# Altium footprint library IC.PcbLib: 386 footprints (part 10 of 30)
Each footprint in its own frame and in the unit in brackets; x right, y up, seen from the top. Pads: shape width x height; smd on the part's side, far side on the other; paste and mask are expansions set on the pad; w line width, h text height; cw(c..) or ccw(c..) is an arc to the next point about the centre after c.
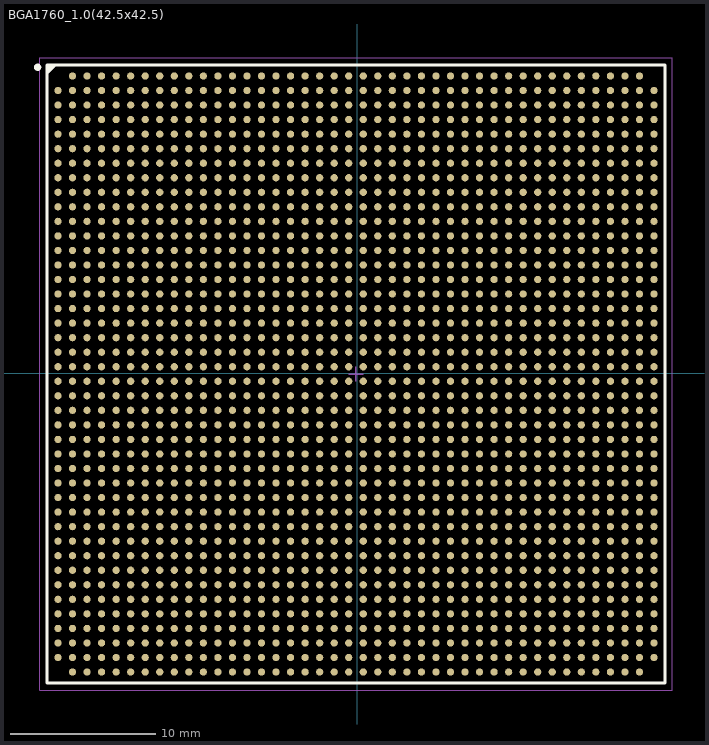
[diagram p9: the footprint, top view; thin cyan lines are the x and y axes]

## BGA1760_1.0(42.5x42.5) [mm]
height 0.65
pads (1760):
  round 0.5 smd: A2(-19.576,20.449) A3(-18.576,20.449) A4(-17.576,20.449) A5(-16.576,20.449) A6(-15.576,20.449) A7(-14.576,20.449) A8(-13.576,20.449) A9(-12.576,20.449) A10(-11.576,20.449) A11(-10.576,20.449) A12(-9.576,20.449) A13(-8.576,20.449) A14(-7.576,20.449) A15(-6.576,20.449) A16(-5.576,20.449) A17(-4.576,20.449) A18(-3.576,20.449) A19(-2.576,20.449) A20(-1.576,20.449) A21(-0.576,20.449) A22(0.424,20.449) A23(1.424,20.449) A24(2.424,20.449) A25(3.424,20.449) A26(4.424,20.449) A27(5.424,20.449) A28(6.424,20.449) A29(7.424,20.449) A30(8.424,20.449) A31(9.424,20.449) A32(10.424,20.449) A33(11.424,20.449) A34(12.424,20.449) A35(13.424,20.449) A36(14.424,20.449) A37(15.424,20.449) A38(16.424,20.449) A39(17.424,20.449) A40(18.424,20.449) A41(19.424,20.449) AA1(-20.576,0.449) AA2(-19.576,0.449) AA3(-18.576,0.449) AA4(-17.576,0.449) AA5(-16.576,0.449) AA6(-15.576,0.449) AA7(-14.576,0.449) AA8(-13.576,0.449) AA9(-12.576,0.449) AA10(-11.576,0.449) AA11(-10.576,0.449) AA12(-9.576,0.449) AA13(-8.576,0.449) AA14(-7.576,0.449) AA15(-6.576,0.449) AA16(-5.576,0.449) AA17(-4.576,0.449) AA18(-3.576,0.449) AA19(-2.576,0.449) AA20(-1.576,0.449) AA21(-0.576,0.449) AA22(0.424,0.449) AA23(1.424,0.449) AA24(2.424,0.449) AA25(3.424,0.449) AA26(4.424,0.449) AA27(5.424,0.449) AA28(6.424,0.449) AA29(7.424,0.449) AA30(8.424,0.449) AA31(9.424,0.449) AA32(10.424,0.449) AA33(11.424,0.449) AA34(12.424,0.449) AA35(13.424,0.449) AA36(14.424,0.449) AA37(15.424,0.449) AA38(16.424,0.449) AA39(17.424,0.449) AA40(18.424,0.449) AA41(19.424,0.449) AA42(20.424,0.449) AB1(-20.576,-0.551) AB2(-19.576,-0.551) AB3(-18.576,-0.551) AB4(-17.576,-0.551) AB5(-16.576,-0.551) AB6(-15.576,-0.551) AB7(-14.576,-0.551) AB8(-13.576,-0.551) AB9(-12.576,-0.551) AB10(-11.576,-0.551) AB11(-10.576,-0.551) AB12(-9.576,-0.551) AB13(-8.576,-0.551) AB14(-7.576,-0.551) AB15(-6.576,-0.551) AB16(-5.576,-0.551) AB17(-4.576,-0.551) AB18(-3.576,-0.551) AB19(-2.576,-0.551) AB20(-1.576,-0.551) AB21(-0.576,-0.551) AB22(0.424,-0.551) AB23(1.424,-0.551) AB24(2.424,-0.551) AB25(3.424,-0.551) AB26(4.424,-0.551) AB27(5.424,-0.551) AB28(6.424,-0.551) AB29(7.424,-0.551) AB30(8.424,-0.551) AB31(9.424,-0.551) AB32(10.424,-0.551) AB33(11.424,-0.551) AB34(12.424,-0.551) AB35(13.424,-0.551) AB36(14.424,-0.551) AB37(15.424,-0.551) AB38(16.424,-0.551) AB39(17.424,-0.551) AB40(18.424,-0.551) AB41(19.424,-0.551) AB42(20.424,-0.551) AC1(-20.576,-1.551) AC2(-19.576,-1.551) AC3(-18.576,-1.551) AC4(-17.576,-1.551) AC5(-16.576,-1.551) AC6(-15.576,-1.551) AC7(-14.576,-1.551) AC8(-13.576,-1.551) AC9(-12.576,-1.551) AC10(-11.576,-1.551) AC11(-10.576,-1.551) AC12(-9.576,-1.551) AC13(-8.576,-1.551) AC14(-7.576,-1.551) AC15(-6.576,-1.551) AC16(-5.576,-1.551) AC17(-4.576,-1.551) AC18(-3.576,-1.551) AC19(-2.576,-1.551) AC20(-1.576,-1.551) AC21(-0.576,-1.551) AC22(0.424,-1.551) AC23(1.424,-1.551) AC24(2.424,-1.551) AC25(3.424,-1.551) AC26(4.424,-1.551) AC27(5.424,-1.551) AC28(6.424,-1.551) AC29(7.424,-1.551) AC30(8.424,-1.551) AC31(9.424,-1.551) AC32(10.424,-1.551) AC33(11.424,-1.551) AC34(12.424,-1.551) AC35(13.424,-1.551) AC36(14.424,-1.551) AC37(15.424,-1.551) AC38(16.424,-1.551) AC39(17.424,-1.551) AC40(18.424,-1.551) AC41(19.424,-1.551) AC42(20.424,-1.551) AD1(-20.576,-2.551) AD2(-19.576,-2.551) AD3(-18.576,-2.551) AD4(-17.576,-2.551) AD5(-16.576,-2.551) AD6(-15.576,-2.551) AD7(-14.576,-2.551) AD8(-13.576,-2.551) AD9(-12.576,-2.551) AD10(-11.576,-2.551) AD11(-10.576,-2.551) AD12(-9.576,-2.551) AD13(-8.576,-2.551) AD14(-7.576,-2.551) AD15(-6.576,-2.551) AD16(-5.576,-2.551) AD17(-4.576,-2.551) AD18(-3.576,-2.551) AD19(-2.576,-2.551) AD20(-1.576,-2.551) AD21(-0.576,-2.551) AD22(0.424,-2.551) AD23(1.424,-2.551) AD24(2.424,-2.551) AD25(3.424,-2.551) AD26(4.424,-2.551) AD27(5.424,-2.551) AD28(6.424,-2.551) AD29(7.424,-2.551) AD30(8.424,-2.551) AD31(9.424,-2.551) AD32(10.424,-2.551) AD33(11.424,-2.551) AD34(12.424,-2.551) AD35(13.424,-2.551) AD36(14.424,-2.551) AD37(15.424,-2.551) AD38(16.424,-2.551) AD39(17.424,-2.551) AD40(18.424,-2.551) AD41(19.424,-2.551) AD42(20.424,-2.551) AE1(-20.576,-3.551) AE2(-19.576,-3.551) AE3(-18.576,-3.551) AE4(-17.576,-3.551) AE5(-16.576,-3.551) AE6(-15.576,-3.551) AE7(-14.576,-3.551) AE8(-13.576,-3.551) AE9(-12.576,-3.551) AE10(-11.576,-3.551) AE11(-10.576,-3.551) AE12(-9.576,-3.551) AE13(-8.576,-3.551) AE14(-7.576,-3.551) AE15(-6.576,-3.551) AE16(-5.576,-3.551) AE17(-4.576,-3.551) AE18(-3.576,-3.551) AE19(-2.576,-3.551) AE20(-1.576,-3.551) AE21(-0.576,-3.551) AE22(0.424,-3.551) AE23(1.424,-3.551) AE24(2.424,-3.551) AE25(3.424,-3.551) AE26(4.424,-3.551) AE27(5.424,-3.551) AE28(6.424,-3.551) AE29(7.424,-3.551) AE30(8.424,-3.551) AE31(9.424,-3.551) AE32(10.424,-3.551) AE33(11.424,-3.551) AE34(12.424,-3.551) AE35(13.424,-3.551) AE36(14.424,-3.551) AE37(15.424,-3.551) AE38(16.424,-3.551) AE39(17.424,-3.551) AE40(18.424,-3.551) AE41(19.424,-3.551) AE42(20.424,-3.551) AF1(-20.576,-4.551) AF2(-19.576,-4.551) AF3(-18.576,-4.551) AF4(-17.576,-4.551) AF5(-16.576,-4.551) AF6(-15.576,-4.551) AF7(-14.576,-4.551) AF8(-13.576,-4.551) AF9(-12.576,-4.551) AF10(-11.576,-4.551) AF11(-10.576,-4.551) AF12(-9.576,-4.551) AF13(-8.576,-4.551) AF14(-7.576,-4.551) AF15(-6.576,-4.551) AF16(-5.576,-4.551) AF17(-4.576,-4.551) AF18(-3.576,-4.551) AF19(-2.576,-4.551) AF20(-1.576,-4.551) AF21(-0.576,-4.551) AF22(0.424,-4.551) AF23(1.424,-4.551) AF24(2.424,-4.551) AF25(3.424,-4.551) AF26(4.424,-4.551) AF27(5.424,-4.551) AF28(6.424,-4.551) AF29(7.424,-4.551) AF30(8.424,-4.551) AF31(9.424,-4.551) AF32(10.424,-4.551) AF33(11.424,-4.551) AF34(12.424,-4.551) AF35(13.424,-4.551) AF36(14.424,-4.551) AF37(15.424,-4.551) AF38(16.424,-4.551) AF39(17.424,-4.551) AF40(18.424,-4.551) AF41(19.424,-4.551) AF42(20.424,-4.551) AG1(-20.576,-5.551) AG2(-19.576,-5.551) AG3(-18.576,-5.551) AG4(-17.576,-5.551) AG5(-16.576,-5.551) AG6(-15.576,-5.551) AG7(-14.576,-5.551) AG8(-13.576,-5.551) AG9(-12.576,-5.551) AG10(-11.576,-5.551) AG11(-10.576,-5.551) AG12(-9.576,-5.551) AG13(-8.576,-5.551) AG14(-7.576,-5.551) AG15(-6.576,-5.551) AG16(-5.576,-5.551) AG17(-4.576,-5.551) AG18(-3.576,-5.551) AG19(-2.576,-5.551) AG20(-1.576,-5.551) AG21(-0.576,-5.551) AG22(0.424,-5.551) AG23(1.424,-5.551) AG24(2.424,-5.551) AG25(3.424,-5.551) AG26(4.424,-5.551) AG27(5.424,-5.551) AG28(6.424,-5.551) AG29(7.424,-5.551) AG30(8.424,-5.551) AG31(9.424,-5.551) AG32(10.424,-5.551) AG33(11.424,-5.551) AG34(12.424,-5.551) AG35(13.424,-5.551) AG36(14.424,-5.551) AG37(15.424,-5.551) AG38(16.424,-5.551) AG39(17.424,-5.551) AG40(18.424,-5.551) AG41(19.424,-5.551) AG42(20.424,-5.551) AH1(-20.576,-6.551) AH2(-19.576,-6.551) AH3(-18.576,-6.551) AH4(-17.576,-6.551) AH5(-16.576,-6.551) AH6(-15.576,-6.551) AH7(-14.576,-6.551) AH8(-13.576,-6.551) AH9(-12.576,-6.551) AH10(-11.576,-6.551) AH11(-10.576,-6.551) AH12(-9.576,-6.551) AH13(-8.576,-6.551) AH14(-7.576,-6.551) AH15(-6.576,-6.551) AH16(-5.576,-6.551) AH17(-4.576,-6.551) AH18(-3.576,-6.551) AH19(-2.576,-6.551) AH20(-1.576,-6.551) AH21(-0.576,-6.551) AH22(0.424,-6.551) AH23(1.424,-6.551) AH24(2.424,-6.551) AH25(3.424,-6.551) AH26(4.424,-6.551) AH27(5.424,-6.551) AH28(6.424,-6.551) AH29(7.424,-6.551) AH30(8.424,-6.551) AH31(9.424,-6.551) AH32(10.424,-6.551) AH33(11.424,-6.551) AH34(12.424,-6.551) AH35(13.424,-6.551) AH36(14.424,-6.551) AH37(15.424,-6.551) AH38(16.424,-6.551) AH39(17.424,-6.551) AH40(18.424,-6.551) AH41(19.424,-6.551) AH42(20.424,-6.551) AJ1(-20.576,-7.551) AJ2(-19.576,-7.551) AJ3(-18.576,-7.551) AJ4(-17.576,-7.551) AJ5(-16.576,-7.551) AJ6(-15.576,-7.551) AJ7(-14.576,-7.551) AJ8(-13.576,-7.551) AJ9(-12.576,-7.551) AJ10(-11.576,-7.551) AJ11(-10.576,-7.551) AJ12(-9.576,-7.551) AJ13(-8.576,-7.551) AJ14(-7.576,-7.551) AJ15(-6.576,-7.551) AJ16(-5.576,-7.551) AJ17(-4.576,-7.551) AJ18(-3.576,-7.551) AJ19(-2.576,-7.551) AJ20(-1.576,-7.551) AJ21(-0.576,-7.551) AJ22(0.424,-7.551) AJ23(1.424,-7.551) AJ24(2.424,-7.551) AJ25(3.424,-7.551) AJ26(4.424,-7.551) AJ27(5.424,-7.551) AJ28(6.424,-7.551) AJ29(7.424,-7.551) AJ30(8.424,-7.551) AJ31(9.424,-7.551) AJ32(10.424,-7.551) AJ33(11.424,-7.551) AJ34(12.424,-7.551) AJ35(13.424,-7.551) AJ36(14.424,-7.551) AJ37(15.424,-7.551) AJ38(16.424,-7.551) AJ39(17.424,-7.551) AJ40(18.424,-7.551) AJ41(19.424,-7.551) AJ42(20.424,-7.551) AK1(-20.576,-8.551) AK2(-19.576,-8.551) AK3(-18.576,-8.551) AK4(-17.576,-8.551) AK5(-16.576,-8.551) AK6(-15.576,-8.551) AK7(-14.576,-8.551) AK8(-13.576,-8.551) AK9(-12.576,-8.551) AK10(-11.576,-8.551) AK11(-10.576,-8.551) AK12(-9.576,-8.551) AK13(-8.576,-8.551) AK14(-7.576,-8.551) AK15(-6.576,-8.551) AK16(-5.576,-8.551) AK17(-4.576,-8.551) AK18(-3.576,-8.551) AK19(-2.576,-8.551) AK20(-1.576,-8.551) AK21(-0.576,-8.551) AK22(0.424,-8.551) AK23(1.424,-8.551) AK24(2.424,-8.551) AK25(3.424,-8.551) AK26(4.424,-8.551) AK27(5.424,-8.551) AK28(6.424,-8.551) AK29(7.424,-8.551) AK30(8.424,-8.551) AK31(9.424,-8.551) AK32(10.424,-8.551) AK33(11.424,-8.551) AK34(12.424,-8.551) AK35(13.424,-8.551) AK36(14.424,-8.551) AK37(15.424,-8.551) AK38(16.424,-8.551) AK39(17.424,-8.551) AK40(18.424,-8.551) AK41(19.424,-8.551) AK42(20.424,-8.551) AL1(-20.576,-9.551) AL2(-19.576,-9.551) AL3(-18.576,-9.551) AL4(-17.576,-9.551) AL5(-16.576,-9.551) AL6(-15.576,-9.551) AL7(-14.576,-9.551) AL8(-13.576,-9.551) AL9(-12.576,-9.551) AL10(-11.576,-9.551) AL11(-10.576,-9.551) AL12(-9.576,-9.551) AL13(-8.576,-9.551) AL14(-7.576,-9.551) AL15(-6.576,-9.551) AL16(-5.576,-9.551) AL17(-4.576,-9.551) AL18(-3.576,-9.551) AL19(-2.576,-9.551) AL20(-1.576,-9.551) AL21(-0.576,-9.551) AL22(0.424,-9.551) AL23(1.424,-9.551) AL24(2.424,-9.551) AL25(3.424,-9.551) AL26(4.424,-9.551) AL27(5.424,-9.551) AL28(6.424,-9.551) AL29(7.424,-9.551) AL30(8.424,-9.551) AL31(9.424,-9.551) AL32(10.424,-9.551) AL33(11.424,-9.551) AL34(12.424,-9.551) AL35(13.424,-9.551) AL36(14.424,-9.551) AL37(15.424,-9.551) AL38(16.424,-9.551) AL39(17.424,-9.551) AL40(18.424,-9.551) AL41(19.424,-9.551) AL42(20.424,-9.551) AM1(-20.576,-10.551) AM2(-19.576,-10.551) AM3(-18.576,-10.551) AM4(-17.576,-10.551) AM5(-16.576,-10.551) AM6(-15.576,-10.551) AM7(-14.576,-10.551) AM8(-13.576,-10.551) AM9(-12.576,-10.551) AM10(-11.576,-10.551) AM11(-10.576,-10.551) AM12(-9.576,-10.551) AM13(-8.576,-10.551) AM14(-7.576,-10.551) AM15(-6.576,-10.551) AM16(-5.576,-10.551) AM17(-4.576,-10.551) AM18(-3.576,-10.551) AM19(-2.576,-10.551) AM20(-1.576,-10.551) AM21(-0.576,-10.551) AM22(0.424,-10.551) AM23(1.424,-10.551) AM24(2.424,-10.551) AM25(3.424,-10.551) AM26(4.424,-10.551) AM27(5.424,-10.551) AM28(6.424,-10.551) AM29(7.424,-10.551) AM30(8.424,-10.551) AM31(9.424,-10.551) AM32(10.424,-10.551) AM33(11.424,-10.551) AM34(12.424,-10.551) AM35(13.424,-10.551) AM36(14.424,-10.551) AM37(15.424,-10.551) AM38(16.424,-10.551) AM39(17.424,-10.551) AM40(18.424,-10.551) AM41(19.424,-10.551) AM42(20.424,-10.551) AN1(-20.576,-11.551) AN2(-19.576,-11.551) AN3(-18.576,-11.551) AN4(-17.576,-11.551) AN5(-16.576,-11.551) AN6(-15.576,-11.551) AN7(-14.576,-11.551) AN8(-13.576,-11.551) AN9(-12.576,-11.551) AN10(-11.576,-11.551) AN11(-10.576,-11.551) AN12(-9.576,-11.551) AN13(-8.576,-11.551) AN14(-7.576,-11.551) AN15(-6.576,-11.551) AN16(-5.576,-11.551) AN17(-4.576,-11.551) AN18(-3.576,-11.551) AN19(-2.576,-11.551) AN20(-1.576,-11.551) AN21(-0.576,-11.551) AN22(0.424,-11.551) AN23(1.424,-11.551) AN24(2.424,-11.551) AN25(3.424,-11.551) AN26(4.424,-11.551) AN27(5.424,-11.551) AN28(6.424,-11.551) AN29(7.424,-11.551) AN30(8.424,-11.551) AN31(9.424,-11.551) AN32(10.424,-11.551) AN33(11.424,-11.551) AN34(12.424,-11.551) AN35(13.424,-11.551) AN36(14.424,-11.551) AN37(15.424,-11.551) AN38(16.424,-11.551) AN39(17.424,-11.551) AN40(18.424,-11.551) AN41(19.424,-11.551) AN42(20.424,-11.551) AP1(-20.576,-12.551) AP2(-19.576,-12.551) AP3(-18.576,-12.551) AP4(-17.576,-12.551) AP5(-16.576,-12.551) AP6(-15.576,-12.551) AP7(-14.576,-12.551) AP8(-13.576,-12.551) AP9(-12.576,-12.551) AP10(-11.576,-12.551) AP11(-10.576,-12.551) AP12(-9.576,-12.551) AP13(-8.576,-12.551) AP14(-7.576,-12.551) AP15(-6.576,-12.551) AP16(-5.576,-12.551) AP17(-4.576,-12.551) AP18(-3.576,-12.551) AP19(-2.576,-12.551) AP20(-1.576,-12.551) AP21(-0.576,-12.551) AP22(0.424,-12.551) AP23(1.424,-12.551) AP24(2.424,-12.551) AP25(3.424,-12.551) AP26(4.424,-12.551) AP27(5.424,-12.551) AP28(6.424,-12.551) AP29(7.424,-12.551) AP30(8.424,-12.551) AP31(9.424,-12.551) AP32(10.424,-12.551) AP33(11.424,-12.551) AP34(12.424,-12.551) AP35(13.424,-12.551) AP36(14.424,-12.551) AP37(15.424,-12.551) AP38(16.424,-12.551) AP39(17.424,-12.551) AP40(18.424,-12.551) AP41(19.424,-12.551) AP42(20.424,-12.551) AR1(-20.576,-13.551) AR2(-19.576,-13.551) AR3(-18.576,-13.551) AR4(-17.576,-13.551) AR5(-16.576,-13.551) AR6(-15.576,-13.551) AR7(-14.576,-13.551) AR8(-13.576,-13.551) AR9(-12.576,-13.551) AR10(-11.576,-13.551) AR11(-10.576,-13.551) AR12(-9.576,-13.551) AR13(-8.576,-13.551) AR14(-7.576,-13.551) AR15(-6.576,-13.551) AR16(-5.576,-13.551) AR17(-4.576,-13.551) AR18(-3.576,-13.551) AR19(-2.576,-13.551) AR20(-1.576,-13.551) AR21(-0.576,-13.551) AR22(0.424,-13.551) AR23(1.424,-13.551) AR24(2.424,-13.551) AR25(3.424,-13.551) AR26(4.424,-13.551) AR27(5.424,-13.551) AR28(6.424,-13.551) AR29(7.424,-13.551) AR30(8.424,-13.551) AR31(9.424,-13.551) AR32(10.424,-13.551) AR33(11.424,-13.551) AR34(12.424,-13.551) AR35(13.424,-13.551) AR36(14.424,-13.551) AR37(15.424,-13.551) AR38(16.424,-13.551) AR39(17.424,-13.551) AR40(18.424,-13.551) AR41(19.424,-13.551) AR42(20.424,-13.551) AT1(-20.576,-14.551) AT2(-19.576,-14.551) AT3(-18.576,-14.551) AT4(-17.576,-14.551) AT5(-16.576,-14.551) AT6(-15.576,-14.551) AT7(-14.576,-14.551) AT8(-13.576,-14.551) AT9(-12.576,-14.551) AT10(-11.576,-14.551) AT11(-10.576,-14.551) AT12(-9.576,-14.551) AT13(-8.576,-14.551) AT14(-7.576,-14.551) AT15(-6.576,-14.551) AT16(-5.576,-14.551) AT17(-4.576,-14.551) AT18(-3.576,-14.551) AT19(-2.576,-14.551) AT20(-1.576,-14.551) AT21(-0.576,-14.551) AT22(0.424,-14.551) AT23(1.424,-14.551) AT24(2.424,-14.551) AT25(3.424,-14.551) AT26(4.424,-14.551) AT27(5.424,-14.551) AT28(6.424,-14.551) AT29(7.424,-14.551) AT30(8.424,-14.551) AT31(9.424,-14.551) AT32(10.424,-14.551) AT33(11.424,-14.551) AT34(12.424,-14.551) AT35(13.424,-14.551) AT36(14.424,-14.551) AT37(15.424,-14.551) AT38(16.424,-14.551) AT39(17.424,-14.551) AT40(18.424,-14.551) AT41(19.424,-14.551) AT42(20.424,-14.551) AU1(-20.576,-15.551) AU2(-19.576,-15.551) AU3(-18.576,-15.551) AU4(-17.576,-15.551) AU5(-16.576,-15.551) AU6(-15.576,-15.551) AU7(-14.576,-15.551) AU8(-13.576,-15.551) AU9(-12.576,-15.551) AU10(-11.576,-15.551) AU11(-10.576,-15.551) AU12(-9.576,-15.551) AU13(-8.576,-15.551) AU14(-7.576,-15.551) AU15(-6.576,-15.551) AU16(-5.576,-15.551) AU17(-4.576,-15.551) AU18(-3.576,-15.551) AU19(-2.576,-15.551) AU20(-1.576,-15.551) AU21(-0.576,-15.551) AU22(0.424,-15.551) AU23(1.424,-15.551) AU24(2.424,-15.551) AU25(3.424,-15.551) AU26(4.424,-15.551) AU27(5.424,-15.551) AU28(6.424,-15.551) AU29(7.424,-15.551) AU30(8.424,-15.551) AU31(9.424,-15.551) AU32(10.424,-15.551) AU33(11.424,-15.551) AU34(12.424,-15.551) AU35(13.424,-15.551) AU36(14.424,-15.551) AU37(15.424,-15.551) AU38(16.424,-15.551) AU39(17.424,-15.551) AU40(18.424,-15.551) AU41(19.424,-15.551) AU42(20.424,-15.551) AV1(-20.576,-16.551) AV2(-19.576,-16.551) AV3(-18.576,-16.551) AV4(-17.576,-16.551) AV5(-16.576,-16.551) AV6(-15.576,-16.551) AV7(-14.576,-16.551) AV8(-13.576,-16.551) AV9(-12.576,-16.551) AV10(-11.576,-16.551) AV11(-10.576,-16.551) AV12(-9.576,-16.551) AV13(-8.576,-16.551) AV14(-7.576,-16.551) AV15(-6.576,-16.551) AV16(-5.576,-16.551) AV17(-4.576,-16.551) AV18(-3.576,-16.551) AV19(-2.576,-16.551) AV20(-1.576,-16.551) AV21(-0.576,-16.551) AV22(0.424,-16.551) AV23(1.424,-16.551) AV24(2.424,-16.551) AV25(3.424,-16.551) AV26(4.424,-16.551) AV27(5.424,-16.551) AV28(6.424,-16.551) AV29(7.424,-16.551) AV30(8.424,-16.551) AV31(9.424,-16.551) AV32(10.424,-16.551) AV33(11.424,-16.551) AV34(12.424,-16.551) AV35(13.424,-16.551) AV36(14.424,-16.551) AV37(15.424,-16.551) AV38(16.424,-16.551) AV39(17.424,-16.551) AV40(18.424,-16.551) AV41(19.424,-16.551) AV42(20.424,-16.551) AW1(-20.576,-17.551) AW2(-19.576,-17.551) AW3(-18.576,-17.551) AW4(-17.576,-17.551) AW5(-16.576,-17.551) AW6(-15.576,-17.551) AW7(-14.576,-17.551) AW8(-13.576,-17.551) AW9(-12.576,-17.551) AW10(-11.576,-17.551) AW11(-10.576,-17.551) AW12(-9.576,-17.551) AW13(-8.576,-17.551) AW14(-7.576,-17.551) AW15(-6.576,-17.551) AW16(-5.576,-17.551) AW17(-4.576,-17.551) AW18(-3.576,-17.551) AW19(-2.576,-17.551) AW20(-1.576,-17.551) AW21(-0.576,-17.551) AW22(0.424,-17.551) AW23(1.424,-17.551) AW24(2.424,-17.551) AW25(3.424,-17.551) AW26(4.424,-17.551) AW27(5.424,-17.551) AW28(6.424,-17.551) AW29(7.424,-17.551) AW30(8.424,-17.551) AW31(9.424,-17.551) AW32(10.424,-17.551) AW33(11.424,-17.551) AW34(12.424,-17.551) AW35(13.424,-17.551) AW36(14.424,-17.551) AW37(15.424,-17.551) AW38(16.424,-17.551) AW39(17.424,-17.551) AW40(18.424,-17.551) AW41(19.424,-17.551) AW42(20.424,-17.551) AY1(-20.576,-18.551) AY2(-19.576,-18.551) AY3(-18.576,-18.551) AY4(-17.576,-18.551) AY5(-16.576,-18.551) AY6(-15.576,-18.551) AY7(-14.576,-18.551) AY8(-13.576,-18.551) AY9(-12.576,-18.551) AY10(-11.576,-18.551) AY11(-10.576,-18.551) AY12(-9.576,-18.551) AY13(-8.576,-18.551) AY14(-7.576,-18.551) AY15(-6.576,-18.551) AY16(-5.576,-18.551) AY17(-4.576,-18.551) AY18(-3.576,-18.551) AY19(-2.576,-18.551) AY20(-1.576,-18.551) AY21(-0.576,-18.551) AY22(0.424,-18.551) AY23(1.424,-18.551) AY24(2.424,-18.551) AY25(3.424,-18.551) AY26(4.424,-18.551) AY27(5.424,-18.551) AY28(6.424,-18.551) AY29(7.424,-18.551) AY30(8.424,-18.551) AY31(9.424,-18.551) AY32(10.424,-18.551) AY33(11.424,-18.551) AY34(12.424,-18.551) AY35(13.424,-18.551) AY36(14.424,-18.551) AY37(15.424,-18.551) AY38(16.424,-18.551) AY39(17.424,-18.551) AY40(18.424,-18.551) AY41(19.424,-18.551) AY42(20.424,-18.551) B1(-20.576,19.449) B2(-19.576,19.449) B3(-18.576,19.449) B4(-17.576,19.449) B5(-16.576,19.449) B6(-15.576,19.449) B7(-14.576,19.449) B8(-13.576,19.449) B9(-12.576,19.449) B10(-11.576,19.449) B11(-10.576,19.449) B12(-9.576,19.449) B13(-8.576,19.449) B14(-7.576,19.449) B15(-6.576,19.449) B16(-5.576,19.449) B17(-4.576,19.449) B18(-3.576,19.449) B19(-2.576,19.449) B20(-1.576,19.449) B21(-0.576,19.449) B22(0.424,19.449) B23(1.424,19.449) B24(2.424,19.449) B25(3.424,19.449) B26(4.424,19.449) B27(5.424,19.449) B28(6.424,19.449) B29(7.424,19.449) B30(8.424,19.449) B31(9.424,19.449) B32(10.424,19.449) B33(11.424,19.449) B34(12.424,19.449) B35(13.424,19.449) B36(14.424,19.449) B37(15.424,19.449) B38(16.424,19.449) B39(17.424,19.449) B40(18.424,19.449) B41(19.424,19.449) B42(20.424,19.449) BA1(-20.576,-19.551) BA2(-19.576,-19.551) BA3(-18.576,-19.551) BA4(-17.576,-19.551) BA5(-16.576,-19.551) BA6(-15.576,-19.551) BA7(-14.576,-19.551) BA8(-13.576,-19.551) BA9(-12.576,-19.551) BA10(-11.576,-19.551) BA11(-10.576,-19.551) BA12(-9.576,-19.551) BA13(-8.576,-19.551) BA14(-7.576,-19.551) BA15(-6.576,-19.551) BA16(-5.576,-19.551) BA17(-4.576,-19.551) BA18(-3.576,-19.551) BA19(-2.576,-19.551) BA20(-1.576,-19.551) BA21(-0.576,-19.551) BA22(0.424,-19.551) BA23(1.424,-19.551) BA24(2.424,-19.551) BA25(3.424,-19.551) BA26(4.424,-19.551) BA27(5.424,-19.551) BA28(6.424,-19.551) BA29(7.424,-19.551) BA30(8.424,-19.551) BA31(9.424,-19.551) BA32(10.424,-19.551) BA33(11.424,-19.551) BA34(12.424,-19.551) BA35(13.424,-19.551) BA36(14.424,-19.551) BA37(15.424,-19.551) BA38(16.424,-19.551) BA39(17.424,-19.551) BA40(18.424,-19.551) BA41(19.424,-19.551) BA42(20.424,-19.551) BB2(-19.576,-20.551) BB3(-18.576,-20.551) BB4(-17.576,-20.551) BB5(-16.576,-20.551) BB6(-15.576,-20.551) BB7(-14.576,-20.551) BB8(-13.576,-20.551) BB9(-12.576,-20.551) BB10(-11.576,-20.551) BB11(-10.576,-20.551) BB12(-9.576,-20.551) BB13(-8.576,-20.551) BB14(-7.576,-20.551) BB15(-6.576,-20.551) BB16(-5.576,-20.551) BB17(-4.576,-20.551) BB18(-3.576,-20.551) BB19(-2.576,-20.551) BB20(-1.576,-20.551) BB21(-0.576,-20.551) BB22(0.424,-20.551) BB23(1.424,-20.551) BB24(2.424,-20.551) BB25(3.424,-20.551) BB26(4.424,-20.551) BB27(5.424,-20.551) BB28(6.424,-20.551) BB29(7.424,-20.551) BB30(8.424,-20.551) BB31(9.424,-20.551) BB32(10.424,-20.551) BB33(11.424,-20.551) BB34(12.424,-20.551) BB35(13.424,-20.551) BB36(14.424,-20.551) BB37(15.424,-20.551) BB38(16.424,-20.551) BB39(17.424,-20.551) BB40(18.424,-20.551) BB41(19.424,-20.551) C1(-20.576,18.449) C2(-19.576,18.449) C3(-18.576,18.449) C4(-17.576,18.449) C5(-16.576,18.449) C6(-15.576,18.449) C7(-14.576,18.449) C8(-13.576,18.449) C9(-12.576,18.449) C10(-11.576,18.449) C11(-10.576,18.449) C12(-9.576,18.449) C13(-8.576,18.449) C14(-7.576,18.449) C15(-6.576,18.449) C16(-5.576,18.449) C17(-4.576,18.449) C18(-3.576,18.449) C19(-2.576,18.449) C20(-1.576,18.449) C21(-0.576,18.449) C22(0.424,18.449) C23(1.424,18.449) C24(2.424,18.449) C25(3.424,18.449) C26(4.424,18.449) C27(5.424,18.449) C28(6.424,18.449) C29(7.424,18.449) C30(8.424,18.449) C31(9.424,18.449) C32(10.424,18.449) C33(11.424,18.449) C34(12.424,18.449) C35(13.424,18.449) C36(14.424,18.449) C37(15.424,18.449) C38(16.424,18.449) C39(17.424,18.449) C40(18.424,18.449) C41(19.424,18.449) C42(20.424,18.449) D1(-20.576,17.449) D2(-19.576,17.449) D3(-18.576,17.449) D4(-17.576,17.449) D5(-16.576,17.449) D6(-15.576,17.449) D7(-14.576,17.449) D8(-13.576,17.449) D9(-12.576,17.449) D10(-11.576,17.449) D11(-10.576,17.449) D12(-9.576,17.449) D13(-8.576,17.449) D14(-7.576,17.449) D15(-6.576,17.449) D16(-5.576,17.449) D17(-4.576,17.449) D18(-3.576,17.449) D19(-2.576,17.449) D20(-1.576,17.449) D21(-0.576,17.449) D22(0.424,17.449) D23(1.424,17.449) D24(2.424,17.449) D25(3.424,17.449) D26(4.424,17.449) D27(5.424,17.449) D28(6.424,17.449) D29(7.424,17.449) D30(8.424,17.449) D31(9.424,17.449) D32(10.424,17.449) D33(11.424,17.449) D34(12.424,17.449) D35(13.424,17.449) D36(14.424,17.449) D37(15.424,17.449) D38(16.424,17.449) D39(17.424,17.449) D40(18.424,17.449) D41(19.424,17.449) D42(20.424,17.449) E1(-20.576,16.449) E2(-19.576,16.449) E3(-18.576,16.449) E4(-17.576,16.449) E5(-16.576,16.449) E6(-15.576,16.449) E7(-14.576,16.449) E8(-13.576,16.449) E9(-12.576,16.449) E10(-11.576,16.449) E11(-10.576,16.449) E12(-9.576,16.449) E13(-8.576,16.449) E14(-7.576,16.449) E15(-6.576,16.449) E16(-5.576,16.449) E17(-4.576,16.449) E18(-3.576,16.449) E19(-2.576,16.449) E20(-1.576,16.449) E21(-0.576,16.449) E22(0.424,16.449) E23(1.424,16.449) E24(2.424,16.449) E25(3.424,16.449) E26(4.424,16.449) E27(5.424,16.449) E28(6.424,16.449) E29(7.424,16.449) E30(8.424,16.449) E31(9.424,16.449) E32(10.424,16.449) E33(11.424,16.449) E34(12.424,16.449) E35(13.424,16.449) E36(14.424,16.449) E37(15.424,16.449) E38(16.424,16.449) E39(17.424,16.449) E40(18.424,16.449) E41(19.424,16.449) E42(20.424,16.449) F1(-20.576,15.449) F2(-19.576,15.449) F3(-18.576,15.449) F4(-17.576,15.449) F5(-16.576,15.449) F6(-15.576,15.449) F7(-14.576,15.449) F8(-13.576,15.449) F9(-12.576,15.449) F10(-11.576,15.449) F11(-10.576,15.449) F12(-9.576,15.449) F13(-8.576,15.449) F14(-7.576,15.449) F15(-6.576,15.449) F16(-5.576,15.449) F17(-4.576,15.449) F18(-3.576,15.449) F19(-2.576,15.449) F20(-1.576,15.449) F21(-0.576,15.449) F22(0.424,15.449) F23(1.424,15.449) F24(2.424,15.449) F25(3.424,15.449) F26(4.424,15.449) F27(5.424,15.449) F28(6.424,15.449) F29(7.424,15.449) F30(8.424,15.449) F31(9.424,15.449) F32(10.424,15.449) F33(11.424,15.449) F34(12.424,15.449) F35(13.424,15.449) F36(14.424,15.449) F37(15.424,15.449) F38(16.424,15.449) F39(17.424,15.449) F40(18.424,15.449) F41(19.424,15.449) F42(20.424,15.449) G1(-20.576,14.449) G2(-19.576,14.449) G3(-18.576,14.449) G4(-17.576,14.449) G5(-16.576,14.449) G6(-15.576,14.449) G7(-14.576,14.449) G8(-13.576,14.449) G9(-12.576,14.449) G10(-11.576,14.449) G11(-10.576,14.449) G12(-9.576,14.449) G13(-8.576,14.449) G14(-7.576,14.449) G15(-6.576,14.449) G16(-5.576,14.449) G17(-4.576,14.449) G18(-3.576,14.449) G19(-2.576,14.449) G20(-1.576,14.449) G21(-0.576,14.449) G22(0.424,14.449) G23(1.424,14.449) G24(2.424,14.449) G25(3.424,14.449) G26(4.424,14.449) G27(5.424,14.449) G28(6.424,14.449) G29(7.424,14.449) G30(8.424,14.449) G31(9.424,14.449) G32(10.424,14.449) G33(11.424,14.449) G34(12.424,14.449) G35(13.424,14.449) G36(14.424,14.449) G37(15.424,14.449) G38(16.424,14.449) G39(17.424,14.449) G40(18.424,14.449) G41(19.424,14.449) G42(20.424,14.449) H1(-20.576,13.449) H2(-19.576,13.449) H3(-18.576,13.449) H4(-17.576,13.449) H5(-16.576,13.449) H6(-15.576,13.449) H7(-14.576,13.449) H8(-13.576,13.449) H9(-12.576,13.449) H10(-11.576,13.449) H11(-10.576,13.449) H12(-9.576,13.449) H13(-8.576,13.449) H14(-7.576,13.449) H15(-6.576,13.449) H16(-5.576,13.449) H17(-4.576,13.449) H18(-3.576,13.449) H19(-2.576,13.449) H20(-1.576,13.449) H21(-0.576,13.449) H22(0.424,13.449) H23(1.424,13.449) H24(2.424,13.449) H25(3.424,13.449) H26(4.424,13.449) H27(5.424,13.449) H28(6.424,13.449) H29(7.424,13.449) H30(8.424,13.449) H31(9.424,13.449) H32(10.424,13.449) H33(11.424,13.449) H34(12.424,13.449) H35(13.424,13.449) H36(14.424,13.449) H37(15.424,13.449) H38(16.424,13.449) H39(17.424,13.449) H40(18.424,13.449) H41(19.424,13.449) H42(20.424,13.449) J1(-20.576,12.449) J2(-19.576,12.449) J3(-18.576,12.449) J4(-17.576,12.449) J5(-16.576,12.449) J6(-15.576,12.449) J7(-14.576,12.449) J8(-13.576,12.449) J9(-12.576,12.449) J10(-11.576,12.449) J11(-10.576,12.449) J12(-9.576,12.449) J13(-8.576,12.449) J14(-7.576,12.449) J15(-6.576,12.449) J16(-5.576,12.449) J17(-4.576,12.449) J18(-3.576,12.449) J19(-2.576,12.449) J20(-1.576,12.449) J21(-0.576,12.449) J22(0.424,12.449) J23(1.424,12.449) J24(2.424,12.449) J25(3.424,12.449) J26(4.424,12.449) J27(5.424,12.449) J28(6.424,12.449) J29(7.424,12.449) J30(8.424,12.449) J31(9.424,12.449) J32(10.424,12.449) J33(11.424,12.449) J34(12.424,12.449) J35(13.424,12.449) J36(14.424,12.449) J37(15.424,12.449) J38(16.424,12.449) J39(17.424,12.449) J40(18.424,12.449) J41(19.424,12.449) J42(20.424,12.449) K1(-20.576,11.449) K2(-19.576,11.449) K3(-18.576,11.449) K4(-17.576,11.449) K5(-16.576,11.449) K6(-15.576,11.449) K7(-14.576,11.449) K8(-13.576,11.449) K9(-12.576,11.449) K10(-11.576,11.449) K11(-10.576,11.449) K12(-9.576,11.449) K13(-8.576,11.449) K14(-7.576,11.449) K15(-6.576,11.449) K16(-5.576,11.449) K17(-4.576,11.449) K18(-3.576,11.449) K19(-2.576,11.449) K20(-1.576,11.449) K21(-0.576,11.449) K22(0.424,11.449) K23(1.424,11.449) K24(2.424,11.449) K25(3.424,11.449) K26(4.424,11.449) K27(5.424,11.449) K28(6.424,11.449) K29(7.424,11.449) K30(8.424,11.449) K31(9.424,11.449) K32(10.424,11.449) K33(11.424,11.449) K34(12.424,11.449) K35(13.424,11.449) K36(14.424,11.449) K37(15.424,11.449) K38(16.424,11.449) K39(17.424,11.449) K40(18.424,11.449) K41(19.424,11.449) K42(20.424,11.449) L1(-20.576,10.449) L2(-19.576,10.449) L3(-18.576,10.449) L4(-17.576,10.449) L5(-16.576,10.449) L6(-15.576,10.449) L7(-14.576,10.449) L8(-13.576,10.449) L9(-12.576,10.449) L10(-11.576,10.449) L11(-10.576,10.449) L12(-9.576,10.449) L13(-8.576,10.449) L14(-7.576,10.449) L15(-6.576,10.449) L16(-5.576,10.449) L17(-4.576,10.449) L18(-3.576,10.449) L19(-2.576,10.449) L20(-1.576,10.449) L21(-0.576,10.449) L22(0.424,10.449) L23(1.424,10.449) L24(2.424,10.449) L25(3.424,10.449) L26(4.424,10.449) L27(5.424,10.449) L28(6.424,10.449) L29(7.424,10.449) L30(8.424,10.449) L31(9.424,10.449) L32(10.424,10.449) L33(11.424,10.449) L34(12.424,10.449) L35(13.424,10.449) L36(14.424,10.449) L37(15.424,10.449) L38(16.424,10.449) L39(17.424,10.449) L40(18.424,10.449) L41(19.424,10.449) L42(20.424,10.449) M1(-20.576,9.449) M2(-19.576,9.449) M3(-18.576,9.449) M4(-17.576,9.449) M5(-16.576,9.449) M6(-15.576,9.449) M7(-14.576,9.449) M8(-13.576,9.449) M9(-12.576,9.449) M10(-11.576,9.449) M11(-10.576,9.449) M12(-9.576,9.449) M13(-8.576,9.449) M14(-7.576,9.449) M15(-6.576,9.449) M16(-5.576,9.449) M17(-4.576,9.449) M18(-3.576,9.449) M19(-2.576,9.449) M20(-1.576,9.449) M21(-0.576,9.449) M22(0.424,9.449) M23(1.424,9.449) M24(2.424,9.449) M25(3.424,9.449) M26(4.424,9.449) M27(5.424,9.449) M28(6.424,9.449) M29(7.424,9.449) M30(8.424,9.449) M31(9.424,9.449) M32(10.424,9.449) M33(11.424,9.449) M34(12.424,9.449) M35(13.424,9.449) M36(14.424,9.449) M37(15.424,9.449) M38(16.424,9.449) M39(17.424,9.449) M40(18.424,9.449) M41(19.424,9.449) M42(20.424,9.449) N1(-20.576,8.449) N2(-19.576,8.449) N3(-18.576,8.449) N4(-17.576,8.449) N5(-16.576,8.449) N6(-15.576,8.449) N7(-14.576,8.449) N8(-13.576,8.449) N9(-12.576,8.449) N10(-11.576,8.449) N11(-10.576,8.449) N12(-9.576,8.449) N13(-8.576,8.449) N14(-7.576,8.449) N15(-6.576,8.449) N16(-5.576,8.449) N17(-4.576,8.449) N18(-3.576,8.449) N19(-2.576,8.449) N20(-1.576,8.449) N21(-0.576,8.449) N22(0.424,8.449) N23(1.424,8.449) N24(2.424,8.449) N25(3.424,8.449) N26(4.424,8.449) N27(5.424,8.449) N28(6.424,8.449) N29(7.424,8.449) N30(8.424,8.449) N31(9.424,8.449) N32(10.424,8.449) N33(11.424,8.449) N34(12.424,8.449) N35(13.424,8.449) N36(14.424,8.449) N37(15.424,8.449) N38(16.424,8.449) N39(17.424,8.449) N40(18.424,8.449) N41(19.424,8.449) N42(20.424,8.449) P1(-20.576,7.449) P2(-19.576,7.449) P3(-18.576,7.449) P4(-17.576,7.449) P5(-16.576,7.449) P6(-15.576,7.449) P7(-14.576,7.449) P8(-13.576,7.449) P9(-12.576,7.449) P10(-11.576,7.449) P11(-10.576,7.449) P12(-9.576,7.449) P13(-8.576,7.449) P14(-7.576,7.449) P15(-6.576,7.449) P16(-5.576,7.449) P17(-4.576,7.449) P18(-3.576,7.449) P19(-2.576,7.449) P20(-1.576,7.449) P21(-0.576,7.449) P22(0.424,7.449) P23(1.424,7.449) P24(2.424,7.449) P25(3.424,7.449) P26(4.424,7.449) P27(5.424,7.449) P28(6.424,7.449) P29(7.424,7.449) P30(8.424,7.449) P31(9.424,7.449) P32(10.424,7.449) P33(11.424,7.449) P34(12.424,7.449) P35(13.424,7.449) P36(14.424,7.449) P37(15.424,7.449) P38(16.424,7.449) P39(17.424,7.449) P40(18.424,7.449) P41(19.424,7.449) P42(20.424,7.449) R1(-20.576,6.449) R2(-19.576,6.449) R3(-18.576,6.449) R4(-17.576,6.449) R5(-16.576,6.449) R6(-15.576,6.449) R7(-14.576,6.449) R8(-13.576,6.449) R9(-12.576,6.449) R10(-11.576,6.449) R11(-10.576,6.449) R12(-9.576,6.449) R13(-8.576,6.449) R14(-7.576,6.449) R15(-6.576,6.449) R16(-5.576,6.449) R17(-4.576,6.449) R18(-3.576,6.449) R19(-2.576,6.449) R20(-1.576,6.449) R21(-0.576,6.449) R22(0.424,6.449) R23(1.424,6.449) R24(2.424,6.449) R25(3.424,6.449) R26(4.424,6.449) R27(5.424,6.449) R28(6.424,6.449) R29(7.424,6.449) R30(8.424,6.449) R31(9.424,6.449) R32(10.424,6.449) R33(11.424,6.449) R34(12.424,6.449) R35(13.424,6.449) R36(14.424,6.449) R37(15.424,6.449) R38(16.424,6.449) R39(17.424,6.449) R40(18.424,6.449) R41(19.424,6.449) R42(20.424,6.449) T1(-20.576,5.449) T2(-19.576,5.449) T3(-18.576,5.449) T4(-17.576,5.449) T5(-16.576,5.449) T6(-15.576,5.449) T7(-14.576,5.449) T8(-13.576,5.449) T9(-12.576,5.449) T10(-11.576,5.449) T11(-10.576,5.449) T12(-9.576,5.449) T13(-8.576,5.449) T14(-7.576,5.449) T15(-6.576,5.449) T16(-5.576,5.449) T17(-4.576,5.449) T18(-3.576,5.449) T19(-2.576,5.449) T20(-1.576,5.449) T21(-0.576,5.449) T22(0.424,5.449) T23(1.424,5.449) T24(2.424,5.449) T25(3.424,5.449) T26(4.424,5.449) T27(5.424,5.449) T28(6.424,5.449) T29(7.424,5.449) T30(8.424,5.449) T31(9.424,5.449) T32(10.424,5.449) T33(11.424,5.449) T34(12.424,5.449) T35(13.424,5.449) T36(14.424,5.449) T37(15.424,5.449) T38(16.424,5.449) T39(17.424,5.449) T40(18.424,5.449) T41(19.424,5.449) T42(20.424,5.449) U1(-20.576,4.449) U2(-19.576,4.449) U3(-18.576,4.449) U4(-17.576,4.449) U5(-16.576,4.449) U6(-15.576,4.449) U7(-14.576,4.449) U8(-13.576,4.449) U9(-12.576,4.449) U10(-11.576,4.449) U11(-10.576,4.449) U12(-9.576,4.449) U13(-8.576,4.449) U14(-7.576,4.449) U15(-6.576,4.449) U16(-5.576,4.449) U17(-4.576,4.449) U18(-3.576,4.449) U19(-2.576,4.449) U20(-1.576,4.449) U21(-0.576,4.449) U22(0.424,4.449) U23(1.424,4.449) U24(2.424,4.449) U25(3.424,4.449) U26(4.424,4.449) U27(5.424,4.449) U28(6.424,4.449) U29(7.424,4.449) U30(8.424,4.449) U31(9.424,4.449) U32(10.424,4.449) U33(11.424,4.449) U34(12.424,4.449) U35(13.424,4.449) U36(14.424,4.449) U37(15.424,4.449) U38(16.424,4.449) U39(17.424,4.449) U40(18.424,4.449) U41(19.424,4.449) U42(20.424,4.449) V1(-20.576,3.449) V2(-19.576,3.449) V3(-18.576,3.449) V4(-17.576,3.449) V5(-16.576,3.449) V6(-15.576,3.449) V7(-14.576,3.449) V8(-13.576,3.449) V9(-12.576,3.449) V10(-11.576,3.449) V11(-10.576,3.449) V12(-9.576,3.449) V13(-8.576,3.449) V14(-7.576,3.449) V15(-6.576,3.449) V16(-5.576,3.449) V17(-4.576,3.449) V18(-3.576,3.449) V19(-2.576,3.449) V20(-1.576,3.449) V21(-0.576,3.449) V22(0.424,3.449) V23(1.424,3.449) V24(2.424,3.449) V25(3.424,3.449) V26(4.424,3.449) V27(5.424,3.449) V28(6.424,3.449) V29(7.424,3.449) V30(8.424,3.449) V31(9.424,3.449) V32(10.424,3.449) V33(11.424,3.449) V34(12.424,3.449) V35(13.424,3.449) V36(14.424,3.449) V37(15.424,3.449) V38(16.424,3.449) V39(17.424,3.449) V40(18.424,3.449) V41(19.424,3.449) V42(20.424,3.449) W1(-20.576,2.449) W2(-19.576,2.449) W3(-18.576,2.449) W4(-17.576,2.449) W5(-16.576,2.449) W6(-15.576,2.449) W7(-14.576,2.449) W8(-13.576,2.449) W9(-12.576,2.449) W10(-11.576,2.449) W11(-10.576,2.449) W12(-9.576,2.449) W13(-8.576,2.449) W14(-7.576,2.449) W15(-6.576,2.449) W16(-5.576,2.449) W17(-4.576,2.449) W18(-3.576,2.449) W19(-2.576,2.449) W20(-1.576,2.449) W21(-0.576,2.449) W22(0.424,2.449) W23(1.424,2.449) W24(2.424,2.449) W25(3.424,2.449) W26(4.424,2.449) W27(5.424,2.449) W28(6.424,2.449) W29(7.424,2.449) W30(8.424,2.449) W31(9.424,2.449) W32(10.424,2.449) W33(11.424,2.449) W34(12.424,2.449) W35(13.424,2.449) W36(14.424,2.449) W37(15.424,2.449) W38(16.424,2.449) W39(17.424,2.449) W40(18.424,2.449) W41(19.424,2.449) W42(20.424,2.449) Y1(-20.576,1.449) Y2(-19.576,1.449) Y3(-18.576,1.449) Y4(-17.576,1.449) Y5(-16.576,1.449) Y6(-15.576,1.449) Y7(-14.576,1.449) Y8(-13.576,1.449) Y9(-12.576,1.449) Y10(-11.576,1.449) Y11(-10.576,1.449) Y12(-9.576,1.449) Y13(-8.576,1.449) Y14(-7.576,1.449) Y15(-6.576,1.449) Y16(-5.576,1.449) Y17(-4.576,1.449) Y18(-3.576,1.449) Y19(-2.576,1.449) Y20(-1.576,1.449) Y21(-0.576,1.449) Y22(0.424,1.449) Y23(1.424,1.449) Y24(2.424,1.449) Y25(3.424,1.449) Y26(4.424,1.449) Y27(5.424,1.449) Y28(6.424,1.449) Y29(7.424,1.449) Y30(8.424,1.449) Y31(9.424,1.449) Y32(10.424,1.449) Y33(11.424,1.449) Y34(12.424,1.449) Y35(13.424,1.449) Y36(14.424,1.449) Y37(15.424,1.449) Y38(16.424,1.449) Y39(17.424,1.449) Y40(18.424,1.449) Y41(19.424,1.449) Y42(20.424,1.449)
Top Overlay:
  circle w0.25: c-21.976,21.049 r0.125
  region: -20.745,21.199 -21.326,20.618 -21.326,21.199
  lines w0.2: -21.326,20.618 -20.745,21.199 ; -21.326,-21.301 21.174,-21.301 21.174,21.199 -21.326,21.199 -21.326,-21.301
Mechanical 13:
  lines w0.1: -21.326,-21.301 21.174,-21.301 21.174,21.199 -21.326,21.199 -21.326,-21.301
Mechanical 15:
  lines w0.05: -21.826,-21.801 21.674,-21.801 21.674,21.699 -21.826,21.699 -21.826,-21.801
  lines w0.1: -0.576,-0.051 0.424,-0.051 ; -0.076,-0.551 -0.076,0.449
3D body "BGA1760C100P42X42_4250X4250X335.step": height 3.35, standoff 0, extent -21.326,-21.301 21.174,21.199